# Altium footprint library IC.PcbLib: 68 footprints (part 4 of 5)
Each footprint in its own frame and in the unit in brackets; x right, y up, seen from the top. Pads: shape width x height; smd on the part's side, far side on the other; paste and mask are expansions set on the pad; w line width, h text height; cw(c..) or ccw(c..) is an arc to the next point about the centre after c.
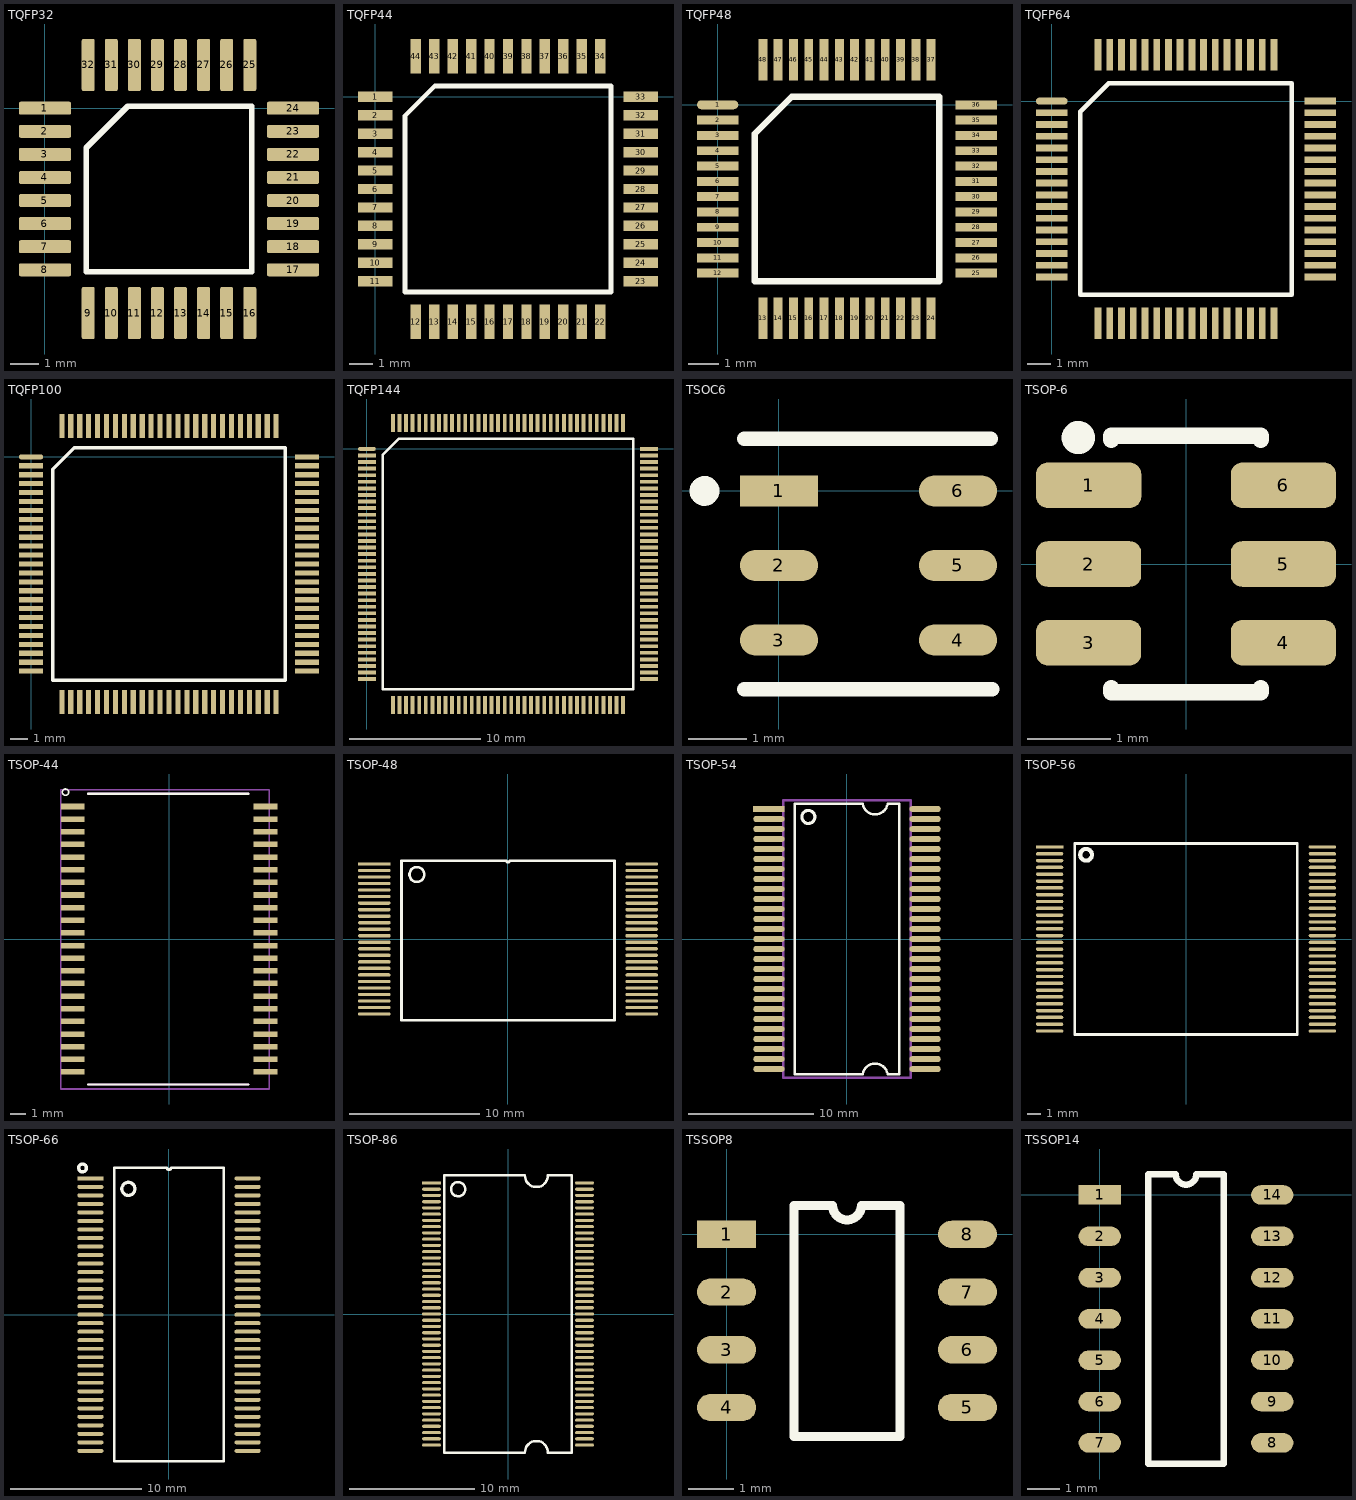
[diagram p3: the footprints below, top view; thin cyan lines are the x and y axes]

## TQFP32 [mm]
pads (32):
  rrect25% 1.8x0.45 smd: 1(0,0) 2(0,-0.8) 3(0,-1.6) 4(0,-2.4) 5(0,-3.2) 6(0,-4) 7(0,-4.8) 8(0,-5.6) 17(8.6,-5.6) 18(8.6,-4.8) 19(8.6,-4) 20(8.6,-3.2) 21(8.6,-2.4) 22(8.6,-1.6) 23(8.6,-0.8) 24(8.6,0)
  rrect25% 0.45x1.8 smd: 9(1.5,-7.1) 10(2.3,-7.1) 11(3.1,-7.1) 12(3.9,-7.1) 13(4.7,-7.1) 14(5.5,-7.1) 15(6.3,-7.1) 16(7.1,-7.1) 25(7.1,1.5) 26(6.3,1.5) 27(5.5,1.5) 28(4.7,1.5) 29(3.9,1.5) 30(3.1,1.5) 31(2.3,1.5) 32(1.5,1.5)
Top Overlay:
  lines w0.2: 1.435,-5.665 1.435,-1.37 2.87,0.065 7.165,0.065 7.165,-5.665 1.435,-5.665
3D body "User Library-TQFP32-2.step": height 0.95, standoff -0.05, extent -0.207,-7.294 8.793,1.706

## TQFP44 [mm] "10*10*1.4"
height 1.4
pads (44):
  rect 1.5x0.45 smd: 1(0,0) 2(0,-0.8) 3(0,-1.6) 4(0,-2.4) 5(0,-3.2) 6(0,-4) 7(0,-4.8) 8(0,-5.6) 9(0,-6.4) 10(0,-7.2) 11(0,-8) 23(11.5,-8) 24(11.5,-7.2) 25(11.5,-6.4) 26(11.5,-5.6) 27(11.5,-4.8) 28(11.5,-4) 29(11.5,-3.2) 30(11.5,-2.4) 31(11.5,-1.6) 32(11.5,-0.8) 33(11.5,0)
  rect 0.45x1.5 smd: 12(1.75,-9.75) 13(2.55,-9.75) 14(3.35,-9.75) 15(4.15,-9.75) 16(4.95,-9.75) 17(5.75,-9.75) 18(6.55,-9.75) 19(7.35,-9.75) 20(8.15,-9.75) 21(8.95,-9.75) 22(9.75,-9.75) 34(9.75,1.75) 35(8.95,1.75) 36(8.15,1.75) 37(7.35,1.75) 38(6.55,1.75) 39(5.75,1.75) 40(4.95,1.75) 41(4.15,1.75) 42(3.35,1.75) 43(2.55,1.75) 44(1.75,1.75)
Top Overlay:
  lines w0.2: 1.285,-8.465 1.285,-0.82 2.57,0.465 10.215,0.465 10.215,-8.465 1.285,-8.465
3D body "User Library-TQFP-44-1.STEP": height 1.1, standoff 0, extent -0.234,-10.019 11.766,1.981

## TQFP48 [mm]
pads (48):
  oval 1.35x0.29 smd: 1(0,0)
  rect 1.35x0.29 smd: 2(0,-0.5) 3(0,-1) 4(0,-1.5) 5(0,-2) 6(0,-2.5) 7(0,-3) 8(0,-3.5) 9(0,-4) 10(0,-4.5) 11(0,-5) 12(0,-5.5) 25(8.45,-5.5) 26(8.45,-5) 27(8.45,-4.5) 28(8.45,-4) 29(8.45,-3.5) 30(8.45,-3) 31(8.45,-2.5) 32(8.45,-2) 33(8.45,-1.5) 34(8.45,-1) 35(8.45,-0.5) 36(8.45,0)
  rect 0.29x1.35 smd: 13(1.475,-6.975) 14(1.975,-6.975) 15(2.475,-6.975) 16(2.975,-6.975) 17(3.475,-6.975) 18(3.975,-6.975) 19(4.475,-6.975) 20(4.975,-6.975) 21(5.475,-6.975) 22(5.975,-6.975) 23(6.475,-6.975) 24(6.975,-6.975) 37(6.975,1.475) 38(6.475,1.475) 39(5.975,1.475) 40(5.475,1.475) 41(4.975,1.475) 42(4.475,1.475) 43(3.975,1.475) 44(3.475,1.475) 45(2.975,1.475) 46(2.475,1.475) 47(1.975,1.475) 48(1.475,1.475)
Top Overlay:
  lines w0.2: 1.21,-5.765 7.24,-5.765 7.24,0.265 2.42,0.265 1.21,-0.945 1.21,-5.765
3D body "User Library-LQFP48-2.STEP": height 1.62, standoff -0.01, extent -0.355,-7.34 8.788,1.803

## TQFP64 [mm]
pads (64):
  oval 1.35x0.29 smd: 1(0,0)
  rect 1.35x0.29 smd: 2(0,-0.5) 3(0,-1) 4(0,-1.5) 5(0,-2) 6(0,-2.5) 7(0,-3) 8(0,-3.5) 9(0,-4) 10(0,-4.5) 11(0,-5) 12(0,-5.5) 13(0,-6) 14(0,-6.5) 15(0,-7) 16(0,-7.5) 33(11.45,-7.5) 34(11.45,-7) 35(11.45,-6.5) 36(11.45,-6) 37(11.45,-5.5) 38(11.45,-5) 39(11.45,-4.5) 40(11.45,-4) 41(11.45,-3.5) 42(11.45,-3) 43(11.45,-2.5) 44(11.45,-2) 45(11.45,-1.5) 46(11.45,-1) 47(11.45,-0.5) 48(11.45,0)
  rect 0.29x1.35 smd: 17(1.975,-9.475) 18(2.475,-9.475) 19(2.975,-9.475) 20(3.475,-9.475) 21(3.975,-9.475) 22(4.475,-9.475) 23(4.975,-9.475) 24(5.475,-9.475) 25(5.975,-9.475) 26(6.475,-9.475) 27(6.975,-9.475) 28(7.475,-9.475) 29(7.975,-9.475) 30(8.475,-9.475) 31(8.975,-9.475) 32(9.475,-9.475) 49(9.475,1.975) 50(8.975,1.975) 51(8.475,1.975) 52(7.975,1.975) 53(7.475,1.975) 54(6.975,1.975) 55(6.475,1.975) 56(5.975,1.975) 57(5.475,1.975) 58(4.975,1.975) 59(4.475,1.975) 60(3.975,1.975) 61(3.475,1.975) 62(2.975,1.975) 63(2.475,1.975) 64(1.975,1.975)
Top Overlay:
  lines w0.2: 1.21,-8.265 1.21,-0.445 2.42,0.765 10.24,0.765 10.24,-8.265 1.21,-8.265
3D body "User Library-LQFP64-2.STEP": height 1.62, standoff -0.01, extent -0.357,-9.831 11.787,2.313

## TQFP100 [mm]
pads (100):
  oval 1.35x0.29 smd: 1(0,0)
  rect 1.35x0.29 smd: 2(0,-0.5) 3(0,-1) 4(0,-1.5) 5(0,-2) 6(0,-2.5) 7(0,-3) 8(0,-3.5) 9(0,-4) 10(0,-4.5) 11(0,-5) 12(0,-5.5) 13(0,-6) 14(0,-6.5) 15(0,-7) 16(0,-7.5) 17(0,-8) 18(0,-8.5) 19(0,-9) 20(0,-9.5) 21(0,-10) 22(0,-10.5) 23(0,-11) 24(0,-11.5) 25(0,-12) 51(15.45,-12) 52(15.45,-11.5) 53(15.45,-11) 54(15.45,-10.5) 55(15.45,-10) 56(15.45,-9.5) 57(15.45,-9) 58(15.45,-8.5) 59(15.45,-8) 60(15.45,-7.5) 61(15.45,-7) 62(15.45,-6.5) 63(15.45,-6) 64(15.45,-5.5) 65(15.45,-5) 66(15.45,-4.5) 67(15.45,-4) 68(15.45,-3.5) 69(15.45,-3) 70(15.45,-2.5) 71(15.45,-2) 72(15.45,-1.5) 73(15.45,-1) 74(15.45,-0.5) 75(15.45,0)
  rect 0.29x1.35 smd: 26(1.725,-13.725) 27(2.225,-13.725) 28(2.725,-13.725) 29(3.225,-13.725) 30(3.725,-13.725) 31(4.225,-13.725) 32(4.725,-13.725) 33(5.225,-13.725) 34(5.725,-13.725) 35(6.225,-13.725) 36(6.725,-13.725) 37(7.225,-13.725) 38(7.725,-13.725) 39(8.225,-13.725) 40(8.725,-13.725) 41(9.225,-13.725) 42(9.725,-13.725) 43(10.225,-13.725) 44(10.725,-13.725) 45(11.225,-13.725) 46(11.725,-13.725) 47(12.225,-13.725) 48(12.725,-13.725) 49(13.225,-13.725) 50(13.725,-13.725) 76(13.725,1.725) 77(13.225,1.725) 78(12.725,1.725) 79(12.225,1.725) 80(11.725,1.725) 81(11.225,1.725) 82(10.725,1.725) 83(10.225,1.725) 84(9.725,1.725) 85(9.225,1.725) 86(8.725,1.725) 87(8.225,1.725) 88(7.725,1.725) 89(7.225,1.725) 90(6.725,1.725) 91(6.225,1.725) 92(5.725,1.725) 93(5.225,1.725) 94(4.725,1.725) 95(4.225,1.725) 96(3.725,1.725) 97(3.225,1.725) 98(2.725,1.725) 99(2.225,1.725) 100(1.725,1.725)
Top Overlay:
  lines w0.2: 1.21,-12.515 1.21,-0.695 2.42,0.515 14.24,0.515 14.24,-12.515 1.21,-12.515
3D body "User Library-LQFP100-3.STEP": height 1.62, standoff -0.01, extent -0.345,-14.086 15.799,2.057

## TQFP144 [mm]
pads (144):
  oval 1.35x0.29 smd: 1(0,0)
  rect 1.35x0.29 smd: 2(0,-0.5) 3(0,-1) 4(0,-1.5) 5(0,-2) 6(0,-2.5) 7(0,-3) 8(0,-3.5) 9(0,-4) 10(0,-4.5) 11(0,-5) 12(0,-5.5) 13(0,-6) 14(0,-6.5) 15(0,-7) 16(0,-7.5) 17(0,-8) 18(0,-8.5) 19(0,-9) 20(0,-9.5) 21(0,-10) 22(0,-10.5) 23(0,-11) 24(0,-11.5) 25(0,-12) 26(0,-12.5) 27(0,-13) 28(0,-13.5) 29(0,-14) 30(0,-14.5) 31(0,-15) 32(0,-15.5) 33(0,-16) 34(0,-16.5) 35(0,-17) 36(0,-17.5) 73(21.45,-17.5) 74(21.45,-17) 75(21.45,-16.5) 76(21.45,-16) 77(21.45,-15.5) 78(21.45,-15) 79(21.45,-14.5) 80(21.45,-14) 81(21.45,-13.5) 82(21.45,-13) 83(21.45,-12.5) 84(21.45,-12) 85(21.45,-11.5) 86(21.45,-11) 87(21.45,-10.5) 88(21.45,-10) 89(21.45,-9.5) 90(21.45,-9) 91(21.45,-8.5) 92(21.45,-8) 93(21.45,-7.5) 94(21.45,-7) 95(21.45,-6.5) 96(21.45,-6) 97(21.45,-5.5) 98(21.45,-5) 99(21.45,-4.5) 100(21.45,-4) 101(21.45,-3.5) 102(21.45,-3) 103(21.45,-2.5) 104(21.45,-2) 105(21.45,-1.5) 106(21.45,-1) 107(21.45,-0.5) 108(21.45,0)
  rect 0.29x1.35 smd: 37(1.975,-19.475) 38(2.475,-19.475) 39(2.975,-19.475) 40(3.475,-19.475) 41(3.975,-19.475) 42(4.475,-19.475) 43(4.975,-19.475) 44(5.475,-19.475) 45(5.975,-19.475) 46(6.475,-19.475) 47(6.975,-19.475) 48(7.475,-19.475) 49(7.975,-19.475) 50(8.475,-19.475) 51(8.975,-19.475) 52(9.475,-19.475) 53(9.975,-19.475) 54(10.475,-19.475) 55(10.975,-19.475) 56(11.475,-19.475) 57(11.975,-19.475) 58(12.475,-19.475) 59(12.975,-19.475) 60(13.475,-19.475) 61(13.975,-19.475) 62(14.475,-19.475) 63(14.975,-19.475) 64(15.475,-19.475) 65(15.975,-19.475) 66(16.475,-19.475) 67(16.975,-19.475) 68(17.475,-19.475) 69(17.975,-19.475) 70(18.475,-19.475) 71(18.975,-19.475) 72(19.475,-19.475) 109(19.475,1.975) 110(18.975,1.975) 111(18.475,1.975) 112(17.975,1.975) 113(17.475,1.975) 114(16.975,1.975) 115(16.475,1.975) 116(15.975,1.975) 117(15.475,1.975) 118(14.975,1.975) 119(14.475,1.975) 120(13.975,1.975) 121(13.475,1.975) 122(12.975,1.975) 123(12.475,1.975) 124(11.975,1.975) 125(11.475,1.975) 126(10.975,1.975) 127(10.475,1.975) 128(9.975,1.975) 129(9.475,1.975) 130(8.975,1.975) 131(8.475,1.975) 132(7.975,1.975) 133(7.475,1.975) 134(6.975,1.975) 135(6.475,1.975) 136(5.975,1.975) 137(5.475,1.975) 138(4.975,1.975) 139(4.475,1.975) 140(3.975,1.975) 141(3.475,1.975) 142(2.975,1.975) 143(2.475,1.975) 144(1.975,1.975)
Top Overlay:
  lines w0.2: 1.21,-18.265 20.24,-18.265 20.24,0.765 2.42,0.765 1.21,-0.445 1.21,-18.265
3D body "User Library-LQFP144-3.STEP": height 1.8, standoff -0.09, extent -0.384,-19.84 21.819,2.362

## TSOC6 [mm]
pads (6):
  rect 1.33x0.53 smd: 1(0,0)
  oval 1.33x0.53 smd: 2(0,-1.27) 3(0,-2.54) 4(3.05,-2.54) 5(3.05,-1.27) 6(3.05,0)
Top Overlay:
  circle w0.254: c-1.27,0 r0.127
  lines w0.254: -0.584,-3.378 3.632,-3.378 ; -0.584,0.889 3.607,0.889
3D body "SW3dPS-TSOC6.STEP": height 1.4, standoff 0, extent -0.581,-3.238 3.619,0.762

## TSOP-6 [mm]
pads (6):
  rrect50% 1.27x0.55 smd paste+0.038 mask+0.038: 1(-1.175,0.95) 2(-1.175,0) 3(-1.175,-0.95) 4(1.175,-0.95) 5(1.175,0) 6(1.175,0.95)
Top Overlay:
  circle w0.3: c-1.3,1.525 r0.05
  lines w0.2: -0.9,-1.5 -0.9,-1.55 0.9,-1.55 0.9,-1.5 ; -0.9,1.5 -0.9,1.55 0.9,1.55 0.9,1.5
3D body "SW3dPS-TSOP6.STEP": height 1.09, standoff 0.04, extent -1.375,-1.5 1.375,1.5

## TSOP-44 [mm]
pads (44):
  rect 1.5x0.35 smd mask+0.05: 1(-6.1,8.4) 2(-6.1,7.6) 3(-6.1,6.8) 4(-6.1,6) 5(-6.1,5.2) 6(-6.1,4.4) 7(-6.1,3.6) 8(-6.1,2.8) 9(-6.1,2) 10(-6.1,1.2) 11(-6.1,0.4) 12(-6.1,-0.4) 13(-6.1,-1.2) 14(-6.1,-2) 15(-6.1,-2.8) 16(-6.1,-3.6) 17(-6.1,-4.4) 18(-6.1,-5.2) 19(-6.1,-6) 20(-6.1,-6.8) 21(-6.1,-7.6) 22(-6.1,-8.4) 23(6.1,-8.4) 24(6.1,-7.6) 25(6.1,-6.8) 26(6.1,-6) 27(6.1,-5.2) 28(6.1,-4.4) 29(6.1,-3.6) 30(6.1,-2.8) 31(6.1,-2) 32(6.1,-1.2) 33(6.1,-0.4) 34(6.1,0.4) 35(6.1,1.2) 36(6.1,2) 37(6.1,2.8) 38(6.1,3.6) 39(6.1,4.4) 40(6.1,5.2) 41(6.1,6) 42(6.1,6.8) 43(6.1,7.6) 44(6.1,8.4)
Top Overlay:
  circle w0.1: c-6.556,9.308 r0.2
  lines w0.127: -5.124,-9.207 5.036,-9.207 ; -5.124,9.208 5.036,9.208
Mechanical 1:
  lines w0.127: -5.124,-9.207 5.036,-9.207 ; -5.124,9.208 5.036,9.208
Mechanical 15:
  lines w0.1: -6.863,-9.478 6.34,-9.478 6.34,9.458 -6.863,9.458 -6.863,-9.478
3D body "SW3dPS-TSOP2-44_IS.STEP": height 1.3, standoff -0.09, extent -5.88,-9.11 5.88,9.1

## TSOP-48 [mm]
pads (48):
  rect 2.5x0.25 smd: 1(-10.25,5.75)
  oval 2.5x0.25 smd: 2(-10.25,5.25) 3(-10.25,4.75) 4(-10.25,4.25) 5(-10.25,3.75) 6(-10.25,3.25) 7(-10.25,2.75) 8(-10.25,2.25) 9(-10.25,1.75) 10(-10.25,1.25) 11(-10.25,0.75) 12(-10.25,0.25) 13(-10.25,-0.25) 14(-10.25,-0.75) 15(-10.25,-1.25) 16(-10.25,-1.75) 17(-10.25,-2.25) 18(-10.25,-2.75) 19(-10.25,-3.25) 20(-10.25,-3.75) 21(-10.25,-4.25) 22(-10.25,-4.75) 23(-10.25,-5.25) 24(-10.25,-5.75) 25(10.25,-5.75) 26(10.25,-5.25) 27(10.25,-4.75) 28(10.25,-4.25) 29(10.25,-3.75) 30(10.25,-3.25) 31(10.25,-2.75) 32(10.25,-2.25) 33(10.25,-1.75) 34(10.25,-1.25) 35(10.25,-0.75) 36(10.25,-0.25) 37(10.25,0.25) 38(10.25,0.75) 39(10.25,1.25) 40(10.25,1.75) 41(10.25,2.25) 42(10.25,2.75) 43(10.25,3.25) 44(10.25,3.75) 45(10.25,4.25) 46(10.25,4.75) 47(10.25,5.25) 48(10.25,5.75)
Top Overlay:
  circle w0.2: c-6.985,4.945 r0.568
  lines w0.2: -8.165,-6.235 -8.165,-5 -8.165,6 -0.125,6 ccw(c0,6) 0.125,6 8.165,6 8.165,-5 8.165,-6.235 -8.165,-6.235
3D body "User Library-TSOP48-1.STEP": height 1.2, standoff 0, extent -10.1,-6.05 10.1,6.05

## TSOP-54 [mm]
pads (54):
  rect 2.5x0.5 smd: 1(-6.25,10.4)
  oval 2.5x0.5 smd: 2(-6.25,9.6) 3(-6.25,8.8) 4(-6.25,8) 5(-6.25,7.2) 6(-6.25,6.4) 7(-6.25,5.6) 8(-6.25,4.8) 9(-6.25,4) 10(-6.25,3.2) 11(-6.25,2.4) 12(-6.25,1.6) 13(-6.25,0.8) 14(-6.25,0) 15(-6.25,-0.8) 16(-6.25,-1.6) 17(-6.25,-2.4) 18(-6.25,-3.2) 19(-6.25,-4) 20(-6.25,-4.8) 21(-6.25,-5.6) 22(-6.25,-6.4) 23(-6.25,-7.2) 24(-6.25,-8) 25(-6.25,-8.8) 26(-6.25,-9.6) 27(-6.25,-10.4) 28(6.25,-10.4) 29(6.25,-9.6) 30(6.25,-8.8) 31(6.25,-8) 32(6.25,-7.2) 33(6.25,-6.4) 34(6.25,-5.6) 35(6.25,-4.8) 36(6.25,-4) 37(6.25,-3.2) 38(6.25,-2.4) 39(6.25,-1.6) 40(6.25,-0.8) 41(6.25,0) 42(6.25,0.8) 43(6.25,1.6) 44(6.25,2.4) 45(6.25,3.2) 46(6.25,4) 47(6.25,4.8) 48(6.25,5.6) 49(6.25,6.4) 50(6.25,7.2) 51(6.25,8) 52(6.25,8.8) 53(6.25,9.6) 54(6.25,10.4)
Top Overlay:
  circle w0.254: c-3.091,9.765 r0.524
  lines w0.2: 1.254,-10.8 -4.165,-10.8 -4.165,10.8 1.254,10.8 ; 1.254,-10.799 cw(c2.253,-10.984) 3.248,-10.781 ; 1.254,10.799 ccw(c2.253,10.984) 3.248,10.781 ; 3.248,-10.8 4.165,-10.8 4.165,10.8 3.248,10.8
Mechanical 1:
  lines w0.2: -5.08,-11.11 5.08,-11.11 5.08,11.11 -5.08,11.11 -5.08,-11.11
3D body "User Library-TSOP-54-1.STEP": height 1.25, standoff 0, extent -5.88,-11.11 5.88,11.11

## TSOP-56 [mm]
pads (56):
  rect 2x0.25 smd: 1(-10,6.75)
  oval 2x0.25 smd: 2(-10,6.25) 3(-10,5.75) 4(-10,5.25) 5(-10,4.75) 6(-10,4.25) 7(-10,3.75) 8(-10,3.25) 9(-10,2.75) 10(-10,2.25) 11(-10,1.75) 12(-10,1.25) 13(-10,0.75) 14(-10,0.25) 15(-10,-0.25) 16(-10,-0.75) 17(-10,-1.25) 18(-10,-1.75) 19(-10,-2.25) 20(-10,-2.75) 21(-10,-3.25) 22(-10,-3.75) 23(-10,-4.25) 24(-10,-4.75) 25(-10,-5.25) 26(-10,-5.75) 27(-10,-6.25) 28(-10,-6.75) 29(10,-6.75) 30(10,-6.25) 31(10,-5.75) 32(10,-5.25) 33(10,-4.75) 34(10,-4.25) 35(10,-3.75) 36(10,-3.25) 37(10,-2.75) 38(10,-2.25) 39(10,-1.75) 40(10,-1.25) 41(10,-0.75) 42(10,-0.25) 43(10,0.25) 44(10,0.75) 45(10,1.25) 46(10,1.75) 47(10,2.25) 48(10,2.75) 49(10,3.25) 50(10,3.75) 51(10,4.25) 52(10,4.75) 53(10,5.25) 54(10,5.75) 55(10,6.25) 56(10,6.75)
Top Overlay:
  circle w0.3: c-7.325,6.175 r0.43
  lines w0.2: -8.165,7 -8.165,-7 8.165,-7 8.165,7 -8.15,7
3D body: height 1.29, standoff -0.4, extent -10.083,-7.29 10.033,7.25

## TSOP-66 [mm]
pads (66):
  rect 2x0.3 smd mask+0.05: 1(-6,10.4)
  oval 2x0.3 smd mask+0.05: 2(-6,9.75) 3(-6,9.1) 4(-6,8.45) 5(-6,7.8) 6(-6,7.15) 7(-6,6.5) 8(-6,5.85) 9(-6,5.2) 10(-6,4.55) 11(-6,3.9) 12(-6,3.25) 13(-6,2.6) 14(-6,1.95) 15(-6,1.3) 16(-6,0.65) 17(-6,0) 18(-6,-0.65) 19(-6,-1.3) 20(-6,-1.95) 21(-6,-2.6) 22(-6,-3.25) 23(-6,-3.9) 24(-6,-4.55) 25(-6,-5.2) 26(-6,-5.85) 27(-6,-6.5) 28(-6,-7.15) 29(-6,-7.8) 30(-6,-8.45) 31(-6,-9.1) 32(-6,-9.75) 33(-6,-10.4) 34(6,-10.4) 35(6,-9.75) 36(6,-9.1) 37(6,-8.45) 38(6,-7.8) 39(6,-7.15) 40(6,-6.5) 41(6,-5.85) 42(6,-5.2) 43(6,-4.55) 44(6,-3.9) 45(6,-3.25) 46(6,-2.6) 47(6,-1.95) 48(6,-1.3) 49(6,-0.65) 50(6,0) 51(6,0.65) 52(6,1.3) 53(6,1.95) 54(6,2.6) 55(6,3.25) 56(6,3.9) 57(6,4.55) 58(6,5.2) 59(6,5.85) 60(6,6.5) 61(6,7.15) 62(6,7.8) 63(6,8.45) 64(6,9.1) 65(6,9.75) 66(6,10.4)
Top Overlay:
  circle w0.254: c-6.6,11.2 r0.3
  circle w0.254: c-3.1,9.6 r0.5
  lines w0.2: -4.165,-11.2 -4.165,11.225 -0.162,11.225 ccw(c0,11.225) 0.162,11.225 4.165,11.225 4.165,-11.2 -4.165,-11.2
3D body "SW3dPS-tsopii66pin.STEP": height 1.2, standoff 0, extent -5.88,-11.11 5.88,11.11

## TSOP-86 [mm]
pads (86):
  rect 1.5x0.25 smd mask+0.05: 1(-6.13,10.5)
  oval 1.5x0.25 smd mask+0.05: 2(-6.13,10) 3(-6.13,9.5) 4(-6.13,9) 5(-6.13,8.5) 6(-6.13,8) 7(-6.13,7.5) 8(-6.13,7) 9(-6.13,6.5) 10(-6.13,6) 11(-6.13,5.5) 12(-6.13,5) 13(-6.13,4.5) 14(-6.13,4) 15(-6.13,3.5) 16(-6.13,3) 17(-6.13,2.5) 18(-6.13,2) 19(-6.13,1.5) 20(-6.13,1) 21(-6.13,0.5) 22(-6.13,0) 23(-6.13,-0.5) 24(-6.13,-1) 25(-6.13,-1.5) 26(-6.13,-2) 27(-6.13,-2.5) 28(-6.13,-3) 29(-6.13,-3.5) 30(-6.13,-4) 31(-6.13,-4.5) 32(-6.13,-5) 33(-6.13,-5.5) 34(-6.13,-6) 35(-6.13,-6.5) 36(-6.13,-7) 37(-6.13,-7.5) 38(-6.13,-8) 39(-6.13,-8.5) 40(-6.13,-9) 41(-6.13,-9.5) 42(-6.13,-10) 43(-6.13,-10.5) 44(6.13,-10.5) 45(6.13,-10) 46(6.13,-9.5) 47(6.13,-9) 48(6.13,-8.5) 49(6.13,-8) 50(6.13,-7.5) 51(6.13,-7) 52(6.13,-6.5) 53(6.13,-6) 54(6.13,-5.5) 55(6.13,-5) 56(6.13,-4.5) 57(6.13,-4) 58(6.13,-3.5) 59(6.13,-3) 60(6.13,-2.5) 61(6.13,-2) 62(6.13,-1.5) 63(6.13,-1) 64(6.13,-0.5) 65(6.13,0) 66(6.13,0.5) 67(6.13,1) 68(6.13,1.5) 69(6.13,2) 70(6.13,2.5) 71(6.13,3) 72(6.13,3.5) 73(6.13,4) 74(6.13,4.5) 75(6.13,5) 76(6.13,5.5) 77(6.13,6) 78(6.13,6.5) 79(6.13,7) 80(6.13,7.5) 81(6.13,8) 82(6.13,8.5) 83(6.13,9) 84(6.13,9.5) 85(6.13,10) 86(6.13,10.5)
Top Overlay:
  circle w0.2: c-4,10 r0.568
  lines w0.2: -5.1,-11.1 -5.1,11.1 1.354,11.1 ccw(c2.275,11.1) 3.196,11.1 5.1,11.1 5.1,-11.1 3.196,-11.1 ccw(c2.275,-11.1) 1.354,-11.1 -5.1,-11.1
3D body "User Library-TSOP-86.STEP": height 1.06, standoff -0.03, extent -5.88,-10.997 5.909,10.997

## TSSOP8 [mm]
pads (8):
  rect 1.3x0.6 smd: 1(0,0)
  oval 1.3x0.6 smd: 2(0,-1.27) 3(0,-2.54) 4(0,-3.81) 5(5.3,-3.81) 6(5.3,-2.54) 7(5.3,-1.27) 8(5.3,0)
Top Overlay:
  lines w0.2: 1.485,-4.445 1.485,0.635 2.332,0.635 ccw(c2.65,0.635) 2.967,0.635 3.815,0.635 3.815,-4.445 1.485,-4.445
3D body "User Library-SOIC-8-1.step": height 1.75, standoff 0, extent -0.333,-4.355 5.667,0.545

## TSSOP14 [mm]
pads (14):
  rect 1.3x0.6 smd: 1(0,0)
  oval 1.3x0.6 smd: 2(0,-1.27) 3(0,-2.54) 4(0,-3.81) 5(0,-5.08) 6(0,-6.35) 7(0,-7.62) 8(5.3,-7.62) 9(5.3,-6.35) 10(5.3,-5.08) 11(5.3,-3.81) 12(5.3,-2.54) 13(5.3,-1.27) 14(5.3,0)
Top Overlay:
  lines w0.2: 1.485,-8.255 3.815,-8.255 3.815,0.635 2.967,0.635 cw(c2.65,0.635) 2.332,0.635 1.485,0.635 1.485,-8.255
3D body "User Library-SOIC-14.step": height 1.75, standoff 0, extent -0.333,-8.185 5.667,0.565